# Altium footprint library SMT.PcbLib: 379 footprints (part 22 of 24)
Each footprint in its own frame and in the unit in brackets; x right, y up, seen from the top. Pads: shape width x height; smd on the part's side, far side on the other; paste and mask are expansions set on the pad; w line width, h text height; cw(c..) or ccw(c..) is an arc to the next point about the centre after c.
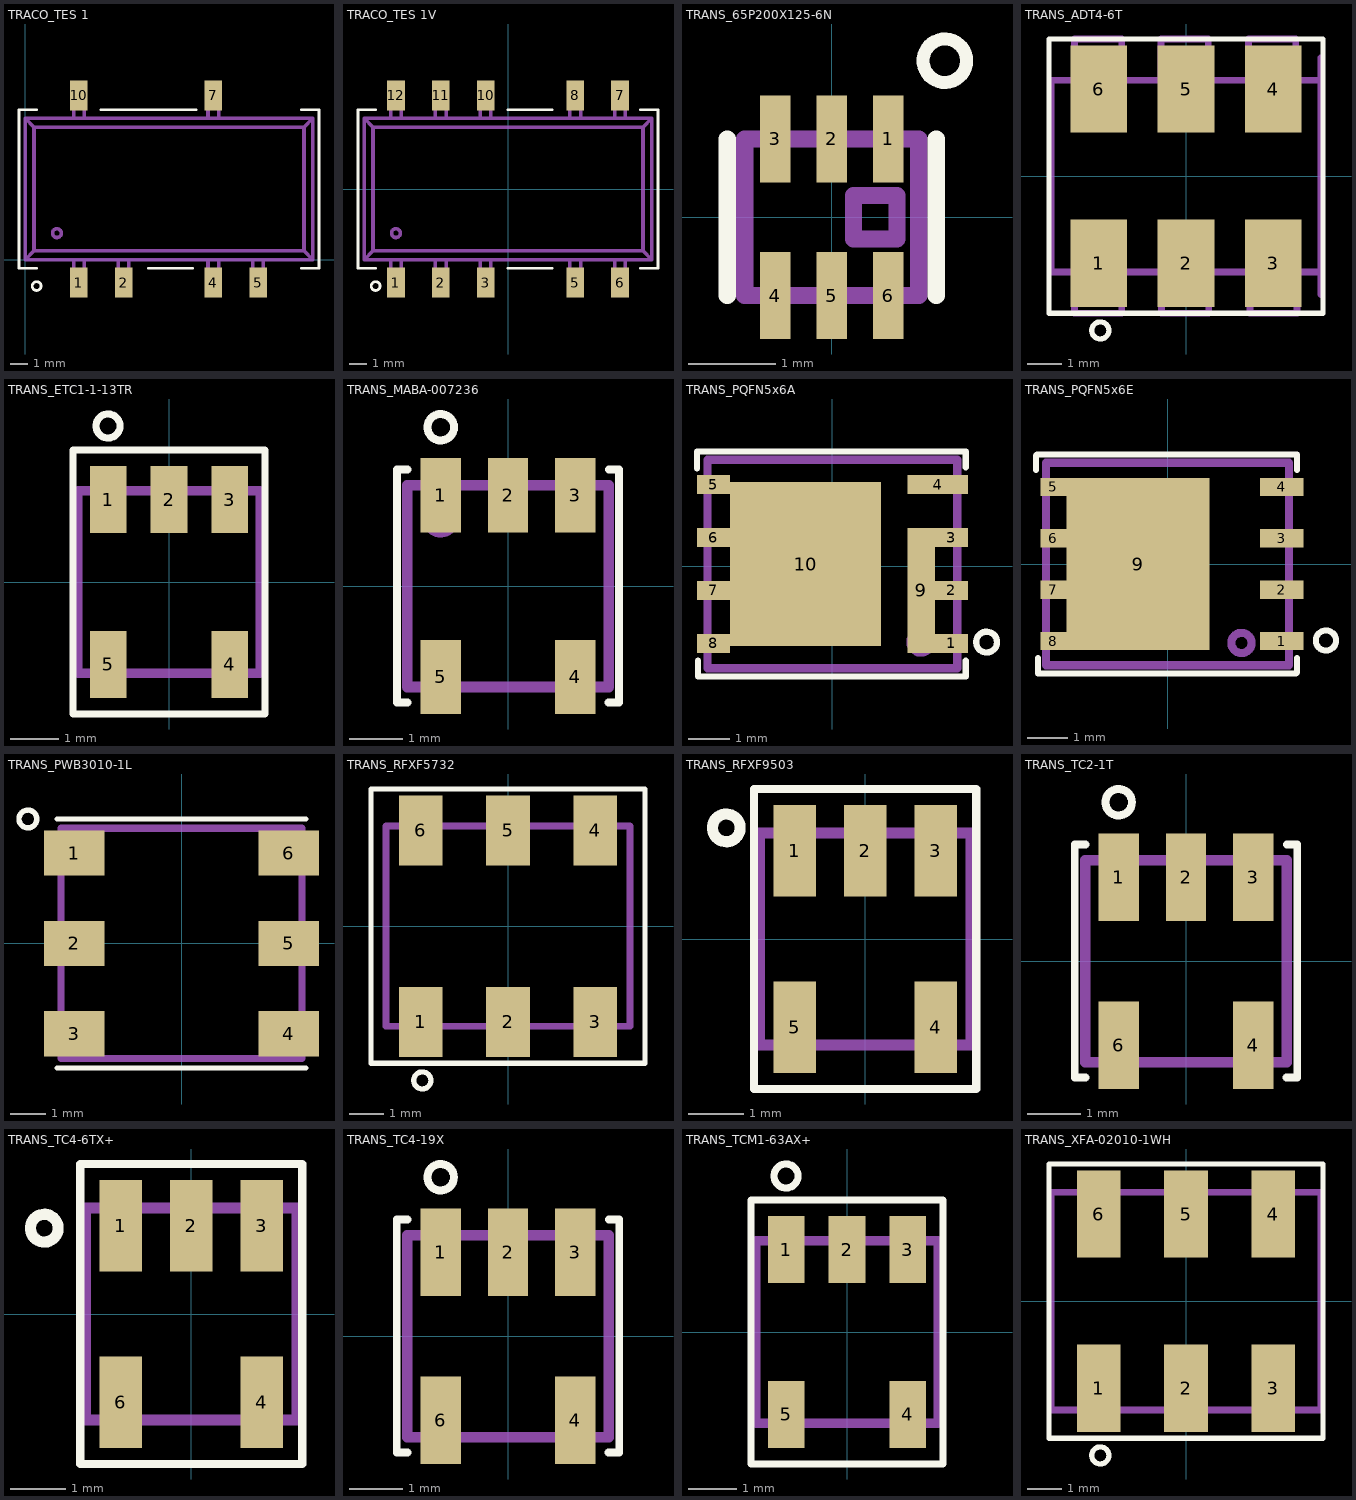
[diagram p21: the footprints below, top view; thin cyan lines are the x and y axes]

## TRACO_TES 1 [mm]
height 7.5
pads (6):
  rect 1x1.7 smd: 1(3.04,-1.3) 2(5.58,-1.3) 4(10.66,-1.3) 5(13.2,-1.3) 7(10.66,9.3) 10(3.04,9.3)
Top Overlay:
  circle w0.15: c0.65,-1.5 r0.25
  lines w0.15: 0.65,-0.5 -0.35,-0.5 -0.35,8.5 0.65,8.5 ; 4.29,8.5 9.69,8.5 ; 6.99,-0.5 9.49,-0.5 ; 15.65,-0.5 16.65,-0.5 16.65,8.5 15.65,8.5
Mechanical 1:
  circle w0.2: c1.8,1.5 r0.25
  lines w0.2: 2.74,0 2.74,-1 2.74,-1.25 ; 2.74,8 2.74,9 2.74,9.25 ; 3.34,0 3.34,-1 3.34,-1.25 ; 3.34,8 3.34,9 3.34,9.25 ; 5.28,0 5.28,-1 5.28,-1.25 ; 5.88,0 5.88,-1 5.88,-1.25 ; 10.36,0 10.36,-1 10.36,-1.25 ; 10.36,8 10.36,9 10.36,9.25 ; 10.96,0 10.96,-1 10.96,-1.25 ; 10.96,8 10.96,9 10.96,9.25 ; 12.9,0 12.9,-1 12.9,-1.25 ; 13.5,0 13.5,-1 13.5,-1.25 ; 0,0 0.5,0.5 ; 0,0 16.3,0 ; 0,0 0,8 ; 0,8 16.3,8 ; 0,8 0.5,7.5 ; 0.5,0.5 15.8,0.5 ; 0.5,0.5 0.5,7.5 ; 0.5,7.5 15.8,7.5 ; 2.74,-1.25 3.34,-1.25 ; 2.74,-1.25 2.74,-1.5 3.34,-1.5 3.34,-1.25 ; 2.74,9.25 2.74,9.5 3.34,9.5 3.34,9.25 ; 2.74,9.25 3.34,9.25 ; 5.28,-1.25 5.88,-1.25 ; 5.28,-1.25 5.28,-1.5 5.88,-1.5 5.88,-1.25 ; 10.36,-1.25 10.36,-1.5 10.96,-1.5 10.96,-1.25 ; 10.36,-1.25 10.96,-1.25 ; 10.36,9.25 10.36,9.5 10.96,9.5 10.96,9.25 ; 10.36,9.25 10.96,9.25 ; 12.9,-1.25 13.5,-1.25 ; 12.9,-1.25 12.9,-1.5 13.5,-1.5 13.5,-1.25 ; 15.8,0.5 16.3,0 ; 15.8,0.5 15.8,7.5 ; 15.8,7.5 16.3,8 ; 16.3,0 16.3,8

## TRACO_TES 1V [mm]
height 8
pads (10):
  rect 1x1.7 smd: 1(-6.35,-5.3) 2(-3.81,-5.3) 3(-1.27,-5.3) 5(3.81,-5.3) 6(6.35,-5.3) 7(6.35,5.3) 8(3.81,5.3) 10(-1.27,5.3) 11(-3.81,5.3) 12(-6.35,5.3)
Top Overlay:
  circle w0.15: c-7.5,-5.5 r0.25
  lines w0.15: -7.5,-4.5 -8.5,-4.5 -8.5,4.5 -7.5,4.5 ; 0,-4.5 2.5,-4.5 ; 0,4.5 2.5,4.5 ; 7.5,-4.5 8.5,-4.5 8.5,4.5 7.5,4.5
Mechanical 1:
  circle w0.2: c-6.35,-2.5 r0.25
  lines w0.2: -6.65,-4 -6.65,-5 -6.65,-5.25 ; -6.65,4 -6.65,5 -6.65,5.25 ; -6.05,-4 -6.05,-5 -6.05,-5.25 ; -6.05,4 -6.05,5 -6.05,5.25 ; -4.11,-4 -4.11,-5 -4.11,-5.25 ; -4.11,4 -4.11,5 -4.11,5.25 ; -3.51,-4 -3.51,-5 -3.51,-5.25 ; -3.51,4 -3.51,5 -3.51,5.25 ; -1.57,-4 -1.57,-5 -1.57,-5.25 ; -1.57,4 -1.57,5 -1.57,5.25 ; -0.97,-4 -0.97,-5 -0.97,-5.25 ; -0.97,4 -0.97,5 -0.97,5.25 ; 3.51,-4 3.51,-5 3.51,-5.25 ; 3.51,4 3.51,5 3.51,5.25 ; 4.11,-4 4.11,-5 4.11,-5.25 ; 4.11,4 4.11,5 4.11,5.25 ; 6.05,-4 6.05,-5 6.05,-5.25 ; 6.05,4 6.05,5 6.05,5.25 ; 6.65,-4 6.65,-5 6.65,-5.25 ; 6.65,4 6.65,5 6.65,5.25 ; -8.15,-4 -8.15,4 ; -8.15,-4 8.15,-4 ; -8.15,-4 -7.65,-3.5 ; -8.15,4 -7.65,3.5 ; -8.15,4 8.15,4 ; -7.65,-3.5 -7.65,3.5 ; -7.65,-3.5 7.65,-3.5 ; -7.65,3.5 7.65,3.5 ; -6.65,-5.25 -6.65,-5.5 -6.05,-5.5 -6.05,-5.25 ; -6.65,-5.25 -6.05,-5.25 ; -6.65,5.25 -6.05,5.25 ; -6.65,5.25 -6.65,5.5 -6.05,5.5 -6.05,5.25 ; -4.11,-5.25 -4.11,-5.5 -3.51,-5.5 -3.51,-5.25 ; -4.11,-5.25 -3.51,-5.25 ; -4.11,5.25 -4.11,5.5 -3.51,5.5 -3.51,5.25 ; -4.11,5.25 -3.51,5.25 ; -1.57,-5.25 -0.97,-5.25 ; -1.57,-5.25 -1.57,-5.5 -0.97,-5.5 -0.97,-5.25 ; -1.57,5.25 -1.57,5.5 -0.97,5.5 -0.97,5.25 ; -1.57,5.25 -0.97,5.25 ; 3.51,-5.25 3.51,-5.5 4.11,-5.5 4.11,-5.25 ; 3.51,-5.25 4.11,-5.25 ; 3.51,5.25 4.11,5.25 ; 3.51,5.25 3.51,5.5 4.11,5.5 4.11,5.25 ; 6.05,-5.25 6.05,-5.5 6.65,-5.5 6.65,-5.25 ; 6.05,-5.25 6.65,-5.25 ; 6.05,5.25 6.05,5.5 6.65,5.5 6.65,5.25 ; 6.05,5.25 6.65,5.25 ; 7.65,-3.5 7.65,3.5 ; 7.65,-3.5 8.15,-4 ; 7.65,3.5 8.15,4 ; 8.15,-4 8.15,4
3D body "TES 1V.stp": height 8, standoff 0, extent -8.15,-5.5 8.15,5.5

## TRANS_65P200X125-6N [mm] "Flat, 6-Leads, Pitch 0,65mm,  Body 2,00x1,25mm,  IPC Medium Density"
height 1.05
pads (6):
  rect 0.35x1 smd mask+0.05: 1(0.65,0.9) 2(0,0.9) 3(-0.65,0.9) 4(-0.65,-0.9) 5(0,-0.9) 6(0.65,-0.9)
Top Overlay:
  circle w0.15: c1.3,1.8 r0.25
  lines w0.2: -1.2,-0.9 -1.2,0.9 ; 1.2,-0.9 1.2,0.9
Mechanical 1:
  lines w0.2: -1,-0.9 -1,0.9 1,0.9 1,-0.9 -1,-0.9 ; 0.25,-0.25 0.75,-0.25 0.75,0.25 0.25,0.25 0.25,-0.25
3D body "CAF-65P200X125-6N.step": height 1.05, standoff 0, extent -1.05,-0.725 1.05,0.725

## TRANS_ADT4-6T [mm] "SMT  TRANSFORMER7.87x5.59x5.23"
height 5.23
pads (6):
  rect 1.65x2.54 smd: 1(-2.54,-2.54) 2(0,-2.54) 3(2.54,-2.54) 4(2.54,2.54) 5(0,2.54) 6(-2.54,2.54)
Top Overlay:
  circle w0.15: c-2.5,-4.5 r0.25
  lines w0.15: -4,-4 -4,4 4,4 4,-4 -4,-4
Mechanical 1:
  circle w0.2: c-2.5,-2.25 r0.25
  lines w0.2: -3.25,-2.795 -3.25,-4 -1.875,-4 -1.875,-2.795 ; -3.25,2.795 -3.25,4 -1.875,4 -1.875,2.795 ; -0.725,2.795 -0.725,4 0.65,4 0.65,2.795 ; -0.71,-2.795 -0.71,-4 0.665,-4 0.665,-2.795 ; 1.825,2.795 1.825,4 3.2,4 3.2,2.795 ; 1.865,-2.795 1.865,-4 3.24,-4 3.24,-2.795 ; 3.935,-3.455 3.935,3.455 ; 3.935,-2.795 -3.935,-2.795 -3.935,2.795 3.935,2.795
3D body "ADT4-6T(ADT4-6T+).stp": height 5.25, standoff 0.02, extent -3.935,-3.48 3.935,3.43

## TRANS_ETC1-1-13TR [mil] "Surface Mount transformer, 3.8x3.8x2.8"
height 110.24
pads (5):
  rect 30x55 smd: 1(-50,67.5) 2(0,67.5) 3(50,67.5) 4(50,-67.5) 5(-50,-67.5)
Top Overlay:
  circle w5.91: c-50,127.95 r9.84
  lines w5.91: -78.74,-108.27 -78.74,108.27 78.74,108.27 78.74,-108.27 -78.74,-108.27
Mechanical 1:
  circle w7.87: c-50,55 r9.84
  lines w7.87: -75,-75 75,-75 75,75 -75,75 -75,-75
3D body "SW3dPS-macom-sm22.STEP": height 111.88, standoff 0.48, extent -75,-95 75,95

## TRANS_MABA-007236 [mm] "Surface Mount transformer, 3.8x3.8x3.45"
height 3.45
pads (5):
  rect 0.76x1.4 smd: 1(-1.27,1.714) 2(0,1.714) 3(1.27,1.714) 4(1.27,-1.714) 5(-1.27,-1.714)
Top Overlay:
  circle w0.15: c-1.27,3 r0.25
  lines w0.15: -1.9,-2.2 -2.1,-2.2 -2.1,2.2 -1.9,2.2 ; 1.9,-2.2 2.1,-2.2 2.1,2.2 1.905,2.2
Mechanical 1:
  circle w0.2: c-1.27,1.27 r0.25
  lines w0.2: -1.905,-1.905 1.905,-1.905 1.905,1.905 -1.905,1.905 -1.905,-1.905
3D body "SW3dPS-macom-sm22.STEP": height 2.84, standoff 0.01, extent -1.905,-2.413 1.905,2.413

## TRANS_PQFN5x6A [mm] "PQFN 5x6 Outline \"A\" Package"
height 1
pads (10):
  rect 0.79x0.46 smd paste-0.01: 1(2.855,-1.855) 2(2.855,-0.585) 3(2.855,0.685) 5(-2.855,1.955) 6(-2.855,0.685) 7(-2.855,-0.585) 8(-2.855,-1.855)
  rect 1.45x0.46 smd paste-0.01: 4(2.525,1.955)
  rect 0.66x3 smd: 9(2.13,-0.585)
  rect 3.63x3.93 smd paste-5: 10(-0.645,0.05)
Top Overlay:
  circle w0.15: c3.7,-1.825 r0.25
  lines w0.15: -3.25,2.35 -3.25,2.75 3.2,2.75 3.2,2.375 ; -3.225,-2.275 -3.225,-2.65 3.2,-2.65 3.2,-2.275
Top Paste:
  rectangle: -0.37,-1.915 1.18,-0.21
  rectangle: -0.37,0.31 1.18,2.015
  rectangle: -2.46,-1.915 -0.88,-0.21
  rectangle: -2.46,0.31 -0.88,2.015
Mechanical 1:
  circle w0.2: c2.125,-1.825 r0.25
  lines w0.2: -3,-2.45 3,-2.45 3,2.55 -3,2.55 -3,-2.45
3D body "User Library-PQFN 5x6-1.STEP": height 1.06, standoff 0.01, extent -3.001,-2.5 3.001,2.5

## TRANS_PQFN5x6E [mm] "PQFN 5x6 Outline \"E\" Package"
height 1.17
pads (9):
  rect 1.08x0.45 smd paste-0.01: 1(2.82,-1.905) 2(2.82,-0.635) 3(2.82,0.635) 4(2.82,1.905)
  rect 0.65x0.45 smd paste-0.01: 5(-2.82,1.905) 6(-2.82,0.635) 7(-2.82,-0.635) 8(-2.82,-1.905)
  rect 3.53x4.26 smd paste-5: 9(-0.73,0)
Top Overlay:
  circle w0.15: c3.91,-1.89 r0.25
  lines w0.15: -3.25,2.325 -3.25,2.675 -3.225,2.7 3.2,2.7 3.2,2.325 ; -3.2,-2.325 -3.2,-2.7 3.175,-2.7 3.2,-2.675 3.2,-2.325
Top Paste:
  rectangle: -0.465,-2.13 1.035,-0.26
  rectangle: -0.465,0.26 1.035,2.13
  rectangle: -2.505,-2.12 -1.005,-0.25
  rectangle: -2.505,0.25 -1.005,2.12
Mechanical 1:
  circle w0.2: c1.825,-1.95 r0.25
  lines w0.2: -3,-2.5 -3,2.5 3,2.5 3,-2.5 -3,-2.5
3D body "User Library-PQFN 5x6.STEP": height 0.91, standoff 0.01, extent -3.01,-2.5 3.01,2.5

## TRANS_PWB3010-1L [mm] "SMT 6,77х6б,48х4,65mm"
height 4.65
pads (6):
  rect 1.7x1.27 smd mask+0.12: 1(-3.015,2.54) 2(-3.015,0) 3(-3.015,-2.54) 4(3.015,-2.54) 5(3.015,0) 6(3.015,2.54)
Top Overlay:
  circle w0.15: c-4.32,3.5 r0.25
  lines w0.15: -3.5,-3.5 3.5,-3.5 ; -3.5,3.5 3.5,3.5
Mechanical 1:
  circle w0.2: c-2.7,2.6 r0.25
  lines w0.2: -3.385,-3.24 3.385,-3.24 3.385,3.24 -3.385,3.24 -3.385,-3.24
3D body "Трансформатор  PWB3010-1L (Coilcraft).stp": height 4.65, standoff 0, extent -3.6,-3.485 3.6,3.485

## TRANS_RFXF5732 [mm] "SMT  TRANSFORMER"
height 4.45
pads (6):
  rect 1.27x2.04 smd: 1(-2.54,-2.79) 2(0,-2.79) 3(2.54,-2.79) 4(2.54,2.79) 5(0,2.79) 6(-2.54,2.79)
Top Overlay:
  circle w0.15: c-2.5,-4.5 r0.25
  lines w0.15: -4,-4 4,-4 4,4 -4,4 -4,-4
Mechanical 1:
  circle w0.2: c-2.5,-2.25 r0.25
  lines w0.2: -3.055,-2.92 -3.055,-3.175 -2.08,-3.175 -2.08,-2.92 ; -3,2.92 -3,3.175 -2.025,3.175 -2.025,2.92 ; -0.515,-2.92 -0.515,-3.175 0.46,-3.175 0.46,-2.92 ; -0.46,2.92 -0.46,3.175 0.515,3.175 0.515,2.92 ; 2.025,-2.92 2.025,-3.175 3,-3.175 3,-2.92 ; 2.08,2.92 2.08,3.175 3.055,3.175 3.055,2.92 ; -3.555,-2.92 3.555,-2.92 3.555,2.92 -3.555,2.92 -3.555,-2.92
3D body "RFXF5732.stp": height 4.47, standoff 0.02, extent -3.555,-3.15 3.555,3.2

## TRANS_RFXF9503 [mm] "Surface Mount 3.81x3.81x2.8 transformer"
height 2.8
pads (5):
  rect 0.76x1.65 smd: 1(-1.27,1.59) 2(0,1.59) 3(1.27,1.59) 4(1.27,-1.59) 5(-1.27,-1.59)
Top Overlay:
  circle w0.2: c-2.5,2 r0.25
  lines w0.15: -2,-2.7 2,-2.7 2,2.7 -2,2.7 -2,-2.7
Mechanical 1:
  circle w0.2: c-1.25,1.25 r0.25
  lines w0.2: -1.905,-1.905 -1.905,1.905 1.905,1.905 1.905,-1.905 -1.905,-1.905
3D body "SW3dPS-macom-sm22.STEP": height 2.84, standoff 0.01, extent -1.905,-2.413 1.905,2.413

## TRANS_TC2-1T [mil] "Surface Mount transformer, 3.8x3.8x3.8"
height 150
pads (5):
  rect 30x65 smd: 1(-50,62.5) 2(0,62.5) 3(50,62.5) 4(50,-62.5) 6(-50,-62.5)
Top Overlay:
  circle w5.91: c-50,118.11 r9.84
  lines w5.91: -74.8,-86.61 -82.68,-86.61 -82.68,86.61 -74.8,86.61 ; 74.8,-86.61 82.68,-86.61 82.68,86.61 75,86.61
Mechanical 1:
  circle w7.87: c-50,50 r9.84
  lines w7.87: -75,-75 -75,75 75,75 75,-75 -75,-75
3D body "Трансформатор TC2-1T(Mini-circuit).stp": height 120.64, standoff 0.48, extent -75,-75 75,75

## TRANS_TC4-6TX+ [mm] "Surface Mount 3.81x3.81x4.06 transformer"
height 4.06
pads (5):
  rect 0.76x1.65 smd: 1(-1.27,1.59) 2(0,1.59) 3(1.27,1.59) 4(1.27,-1.59) 6(-1.27,-1.59)
Top Overlay:
  circle w0.2: c-2.645,1.545 r0.25
  lines w0.15: -2,-2.7 -2,2.7 2,2.7 2,-2.7 -2,-2.7
Mechanical 1:
  circle w0.2: c-1.25,1.25 r0.25
  lines w0.2: -1.905,-1.905 1.905,-1.905 1.905,1.905 -1.905,1.905 -1.905,-1.905
3D body "TC4-6TX+.stp": height 4.08, standoff 0.02, extent -1.905,-2.1 1.905,2.1

## TRANS_TC4-19X [mil] "Surface Mount transformer, 3.8x3.8x4"
height 159.84
pads (5):
  rect 30x65 smd: 1(-50,62.5) 2(0,62.5) 3(50,62.5) 4(50,-62.5) 6(-50,-62.5)
Top Overlay:
  circle w5.91: c-50,118.11 r9.84
  lines w5.91: -74.8,-86.61 -82.68,-86.61 -82.68,86.61 -74.8,86.61 ; 74.8,-86.61 82.68,-86.61 82.68,86.61 75,86.61
Mechanical 1:
  circle w7.87: c-50,50 r9.84
  lines w7.87: -75,-75 -75,75 75,75 75,-75 -75,-75
3D body "TC4-19X.STEP": height 160.44, standoff 0.6, extent -75,-75.2 75,75.2

## TRANS_TCM1-63AX+ [mil] "Surface Mount transformer, 3.8x3.8x2.8"
height 110.24
pads (5):
  rect 30x55 smd: 1(-50,67.5) 2(0,67.5) 3(50,67.5) 4(50,-67.5) 5(-50,-67.5)
Top Overlay:
  circle w5.91: c-50,127.95 r9.84
  lines w5.91: -78.74,-108.27 78.74,-108.27 78.74,108.27 -78.74,108.27 -78.74,-108.27
Mechanical 1:
  circle w7.87: c-50,55 r9.84
  lines w7.87: -75,-75 -75,75 75,75 75,-75 -75,-75
3D body "SW3dPS-macom-sm22.STEP": height 111.88, standoff 0.48, extent -75,-95 75,95

## TRANS_XFA-02010-1WH [mm] "SMT  TRANSFORMER"
height 4.96
pads (6):
  rect 1.27x2.54 smd: 1(-2.54,-2.54) 2(0,-2.54) 3(2.54,-2.54) 4(2.54,2.54) 5(0,2.54) 6(-2.54,2.54)
Top Overlay:
  circle w0.15: c-2.5,-4.5 r0.25
  lines w0.15: -4,-4 4,-4 4,4 -4,4 -4,-4
Mechanical 1:
  circle w0.2: c-2.5,-2.25 r0.25
  lines w0.2: -3.937,-3.175 3.937,-3.175 3.937,3.175 -3.937,3.175 -3.937,-3.175
3D body "RFMD_XFA.stp": height 5.44, standoff -0.02, extent -3.937,-3.843 3.937,3.81